# Altium integrated library Samtec_2_mm_Pitch_Socket_Strips.IntLib: 251 symbols (part 2 of 3) (continued)
## SMM-120-02-L-D-K
designator J?
Tiger Eye(TM) Socket Strip, Surface Mount, Vertical, -55 to 125 degC, 2 mm Pitch, 40-Pin, Female, RoHS; Manufacturer: Samtec; PartNumber: SMM-120-02-L-D-K; Pitch: 2 mm; DatasheetVersion: F-214; PackageVersion: AU, 5/1991; PackageReference: SMM-120-02-X-D-K; PackageDescription: 2 mm Socket Strip; Orientation: Vertical; RoHS: True; Temperature Range: -55 to 125 degC; Mounting Technology: Surface Mount; ComponentLink1Description: Manufacturer URL; ComponentLink1URL: http://www.samtec.com; ComponentLink2Description: Datasheet; ComponentLink2URL: http://www.samtec.com/documents/webfiles/pdf/SMM.PDF; ComponentLink3Description: Package Specification; ComponentLink3URL: http://www.samtec.com/documents/webfiles/cpdf/SMM-1XX-XX-XX-D-XX-XX-X-XX-MKT1.pdf
footprint SMTC-SMM-120-02-X-D-K (Socket Strip, 2x20 Pins, Vertical, 2mm Pitch, Female)
pins: 1, 2, 3, 4, 5, 6, 7, 8, 9, 10, 11, 12, 13, 14, 15, 16, 17, 18, 19, 20, 21, 22, 23, 24, 25, 26, 27, 28, 29, 30, 31, 32, 33, 34, 35, 36, 37, 38, 39, 40

## SMM-120-02-L-S
designator J?
Tiger Eye(TM) Socket Strip, Surface Mount, Vertical, -55 to 125 degC, 2 mm Pitch, 20-Pin, Female, RoHS; Manufacturer: Samtec; PartNumber: SMM-120-02-L-S; Pitch: 2 mm; DatasheetVersion: F-214; PackageVersion: BC, 5/1991; PackageReference: SMM-120-02-X-S; PackageDescription: 2 mm Socket Strip (Single Row); Orientation: Vertical; RoHS: True; Temperature Range: -55 to 125 degC; Mounting Technology: Surface Mount; ComponentLink1Description: Manufacturer URL; ComponentLink1URL: http://www.samtec.com; ComponentLink2Description: Datasheet; ComponentLink2URL: http://www.samtec.com/documents/webfiles/pdf/SMM.PDF; ComponentLink3Description: Package Specification; ComponentLink3URL: http://www.samtec.com/documents/webfiles/cpdf/SMM-1XX-XX-XX-S-XX-X-XX-XX-MKT.pdf
footprint SMTC-SMM-120-02-X-S (Socket Strip, 20 Pins, Vertical, 2mm Pitch, Female)
pins: 1, 2, 3, 4, 5, 6, 7, 8, 9, 10, 11, 12, 13, 14, 15, 16, 17, 18, 19, 20

## SMM-120-02-S-D-K
designator J?
Tiger Eye(TM) Socket Strip, Surface Mount, Vertical, -55 to 125 degC, 2 mm Pitch, 40-Pin, Female, RoHS; Manufacturer: Samtec; PartNumber: SMM-120-02-S-D-K; Pitch: 2 mm; DatasheetVersion: F-214; PackageVersion: AU, 5/1991; PackageReference: SMM-120-02-X-D-K; PackageDescription: 2 mm Socket Strip; Orientation: Vertical; RoHS: True; Temperature Range: -55 to 125 degC; Mounting Technology: Surface Mount; ComponentLink1Description: Manufacturer URL; ComponentLink1URL: http://www.samtec.com; ComponentLink2Description: Datasheet; ComponentLink2URL: http://www.samtec.com/documents/webfiles/pdf/SMM.PDF; ComponentLink3Description: Package Specification; ComponentLink3URL: http://www.samtec.com/documents/webfiles/cpdf/SMM-1XX-XX-XX-D-XX-XX-X-XX-MKT1.pdf
footprint SMTC-SMM-120-02-X-D-K (Socket Strip, 2x20 Pins, Vertical, 2mm Pitch, Female)
pins: 1, 2, 3, 4, 5, 6, 7, 8, 9, 10, 11, 12, 13, 14, 15, 16, 17, 18, 19, 20, 21, 22, 23, 24, 25, 26, 27, 28, 29, 30, 31, 32, 33, 34, 35, 36, 37, 38, 39, 40

## SMM-120-02-S-S
designator J?
Tiger Eye(TM) Socket Strip, Surface Mount, Vertical, -55 to 125 degC, 2 mm Pitch, 20-Pin, Female, RoHS; Manufacturer: Samtec; PartNumber: SMM-120-02-S-S; Pitch: 2 mm; DatasheetVersion: F-214; PackageVersion: BC, 5/1991; PackageReference: SMM-120-02-X-S; PackageDescription: 2 mm Socket Strip (Single Row); Supplier 1: Digi-Key; Supplier Part Number 1: SAM1244-20-ND; Orientation: Vertical; RoHS: True; Temperature Range: -55 to 125 degC; Mounting Technology: Surface Mount; ComponentLink1Description: Manufacturer URL; ComponentLink1URL: http://www.samtec.com; ComponentLink2Description: Datasheet; ComponentLink2URL: http://www.samtec.com/documents/webfiles/pdf/SMM.PDF; ComponentLink3Description: Package Specification; ComponentLink3URL: http://www.samtec.com/documents/webfiles/cpdf/SMM-1XX-XX-XX-S-XX-X-XX-XX-MKT.pdf
footprint SMTC-SMM-120-02-X-S (Socket Strip, 20 Pins, Vertical, 2mm Pitch, Female)
pins: 1, 2, 3, 4, 5, 6, 7, 8, 9, 10, 11, 12, 13, 14, 15, 16, 17, 18, 19, 20

## SMM-125-01-F-D
designator J?
Tiger Eye(TM) Socket Strip, Through-hole, Vertical, -55 to 125 degC, 2 mm Pitch, 50-Pin, Female, RoHS; Manufacturer: Samtec; PartNumber: SMM-125-01-F-D; Pitch: 2 mm; DatasheetVersion: F-214; PackageVersion: AU, 5/1991; PackageReference: SMM-125-01-X-D; PackageDescription: 2 mm Socket Strip; Orientation: Vertical; RoHS: True; Temperature Range: -55 to 125 degC; Mounting Technology: Through-hole; ComponentLink1Description: Manufacturer URL; ComponentLink1URL: http://www.samtec.com; ComponentLink2Description: Datasheet; ComponentLink2URL: http://www.samtec.com/documents/webfiles/pdf/SMM.PDF; ComponentLink3Description: Package Specification; ComponentLink3URL: http://www.samtec.com/documents/webfiles/cpdf/SMM-1XX-XX-XX-D-XX-XX-X-XX-MKT1.pdf
footprint SMTC-SMM-125-01-X-D (Socket Strip, 2x25 Pins, Vertical, 2mm Pitch, Female)
pins: 1, 2, 3, 4, 5, 6, 7, 8, 9, 10, 11, 12, 13, 14, 15, 16, 17, 18, 19, 20, 21, 22, 23, 24, 25, 26, 27, 28, 29, 30, 31, 32, 33, 34, 35, 36, 37, 38, 39, 40, 41, 42, 43, 44, 45, 46, 47, 48, 49, 50

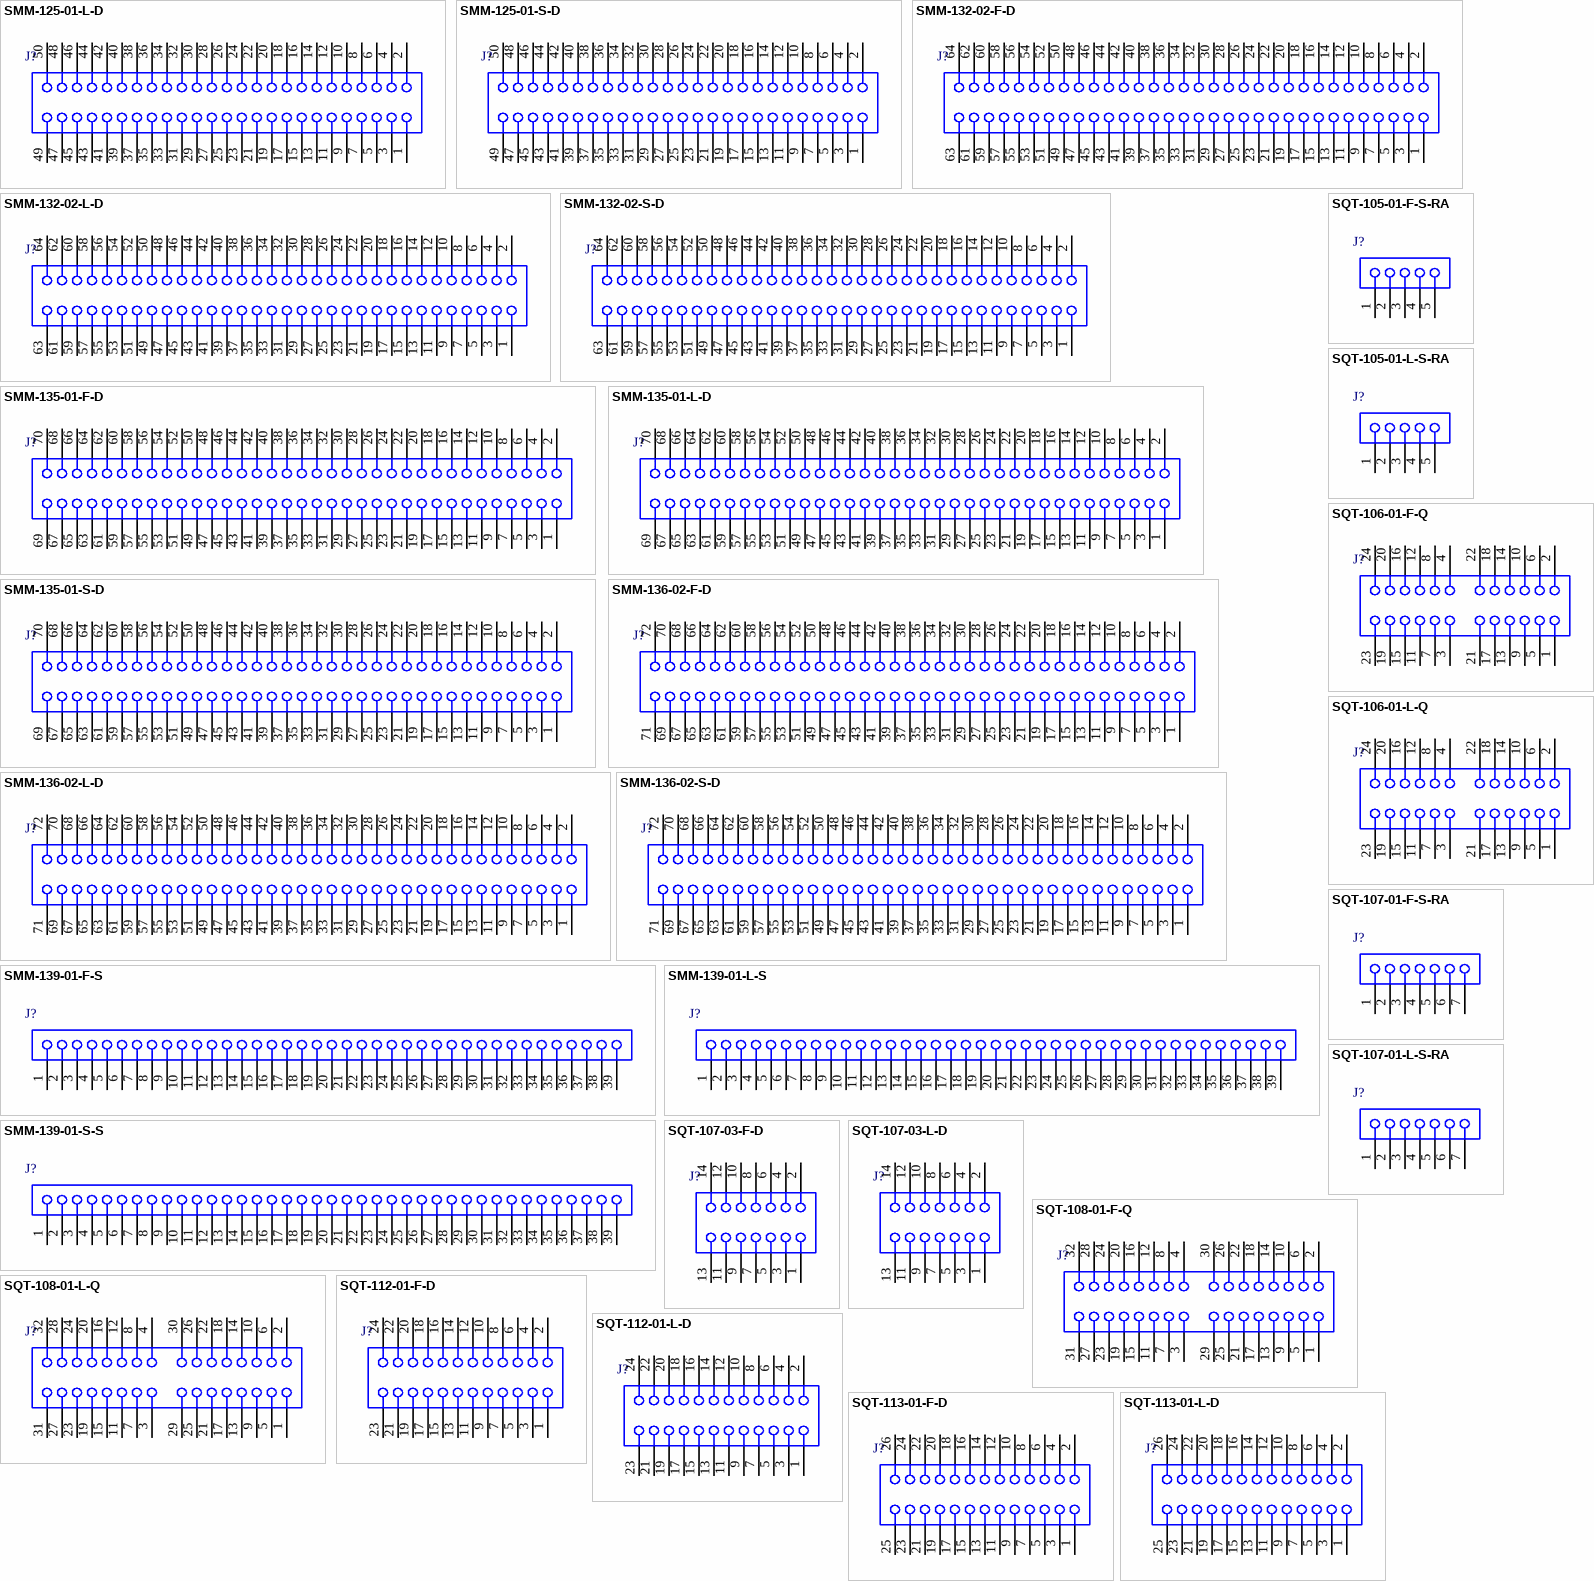
[diagram p5: symbols SMM-125-01-L-D to SQT-113-01-L-D]

## SMM-125-01-L-D
designator J?
Tiger Eye(TM) Socket Strip, Through-hole, Vertical, -55 to 125 degC, 2 mm Pitch, 50-Pin, Female, RoHS; Manufacturer: Samtec; PartNumber: SMM-125-01-L-D; Pitch: 2 mm; DatasheetVersion: F-214; PackageVersion: AU, 5/1991; PackageReference: SMM-125-01-X-D; PackageDescription: 2 mm Socket Strip; Orientation: Vertical; RoHS: True; Temperature Range: -55 to 125 degC; Mounting Technology: Through-hole; ComponentLink1Description: Manufacturer URL; ComponentLink1URL: http://www.samtec.com; ComponentLink2Description: Datasheet; ComponentLink2URL: http://www.samtec.com/documents/webfiles/pdf/SMM.PDF; ComponentLink3Description: Package Specification; ComponentLink3URL: http://www.samtec.com/documents/webfiles/cpdf/SMM-1XX-XX-XX-D-XX-XX-X-XX-MKT1.pdf
footprint SMTC-SMM-125-01-X-D (Socket Strip, 2x25 Pins, Vertical, 2mm Pitch, Female)
pins: 1, 2, 3, 4, 5, 6, 7, 8, 9, 10, 11, 12, 13, 14, 15, 16, 17, 18, 19, 20, 21, 22, 23, 24, 25, 26, 27, 28, 29, 30, 31, 32, 33, 34, 35, 36, 37, 38, 39, 40, 41, 42, 43, 44, 45, 46, 47, 48, 49, 50

## SMM-125-01-S-D
designator J?
Tiger Eye(TM) Socket Strip, Through-hole, Vertical, -55 to 125 degC, 2 mm Pitch, 50-Pin, Female, RoHS; Manufacturer: Samtec; PartNumber: SMM-125-01-S-D; Pitch: 2 mm; DatasheetVersion: F-214; PackageVersion: AU, 5/1991; PackageReference: SMM-125-01-X-D; PackageDescription: 2 mm Socket Strip; Orientation: Vertical; RoHS: True; Temperature Range: -55 to 125 degC; Mounting Technology: Through-hole; ComponentLink1Description: Manufacturer URL; ComponentLink1URL: http://www.samtec.com; ComponentLink2Description: Datasheet; ComponentLink2URL: http://www.samtec.com/documents/webfiles/pdf/SMM.PDF; ComponentLink3Description: Package Specification; ComponentLink3URL: http://www.samtec.com/documents/webfiles/cpdf/SMM-1XX-XX-XX-D-XX-XX-X-XX-MKT1.pdf
footprint SMTC-SMM-125-01-X-D (Socket Strip, 2x25 Pins, Vertical, 2mm Pitch, Female)
pins: 1, 2, 3, 4, 5, 6, 7, 8, 9, 10, 11, 12, 13, 14, 15, 16, 17, 18, 19, 20, 21, 22, 23, 24, 25, 26, 27, 28, 29, 30, 31, 32, 33, 34, 35, 36, 37, 38, 39, 40, 41, 42, 43, 44, 45, 46, 47, 48, 49, 50

## SMM-132-02-F-D
designator J?
Tiger Eye(TM) Socket Strip, Surface Mount, Vertical, -55 to 125 degC, 2 mm Pitch, 64-Pin, Female, RoHS; Manufacturer: Samtec; PartNumber: SMM-132-02-F-D; Pitch: 2 mm; DatasheetVersion: F-214; PackageVersion: AU, 5/1991; PackageReference: SMM-132-02-X-D; PackageDescription: 2 mm Socket Strip; Orientation: Vertical; RoHS: True; Temperature Range: -55 to 125 degC; Mounting Technology: Surface Mount; ComponentLink1Description: Manufacturer URL; ComponentLink1URL: http://www.samtec.com; ComponentLink2Description: Datasheet; ComponentLink2URL: http://www.samtec.com/documents/webfiles/pdf/SMM.PDF; ComponentLink3Description: Package Specification; ComponentLink3URL: http://www.samtec.com/documents/webfiles/cpdf/SMM-1XX-XX-XX-D-XX-XX-X-XX-MKT1.pdf
footprint SMTC-SMM-132-02-X-D (Socket Strip, 2x32 Pins, Vertical, 2mm Pitch, Female)
pins: 1, 2, 3, 4, 5, 6, 7, 8, 9, 10, 11, 12, 13, 14, 15, 16, 17, 18, 19, 20, 21, 22, 23, 24, 25, 26, 27, 28, 29, 30, 31, 32, 33, 34, 35, 36, 37, 38, 39, 40, 41, 42, 43, 44, 45, 46, 47, 48, 49, 50, 51, 52, 53, 54, 55, 56, 57, 58, 59, 60, 61, 62, 63, 64

## SMM-132-02-L-D
designator J?
Tiger Eye(TM) Socket Strip, Surface Mount, Vertical, -55 to 125 degC, 2 mm Pitch, 64-Pin, Female, RoHS; Manufacturer: Samtec; PartNumber: SMM-132-02-L-D; Pitch: 2 mm; DatasheetVersion: F-214; PackageVersion: AU, 5/1991; PackageReference: SMM-132-02-X-D; PackageDescription: 2 mm Socket Strip; Orientation: Vertical; RoHS: True; Temperature Range: -55 to 125 degC; Mounting Technology: Surface Mount; ComponentLink1Description: Manufacturer URL; ComponentLink1URL: http://www.samtec.com; ComponentLink2Description: Datasheet; ComponentLink2URL: http://www.samtec.com/documents/webfiles/pdf/SMM.PDF; ComponentLink3Description: Package Specification; ComponentLink3URL: http://www.samtec.com/documents/webfiles/cpdf/SMM-1XX-XX-XX-D-XX-XX-X-XX-MKT1.pdf
footprint SMTC-SMM-132-02-X-D (Socket Strip, 2x32 Pins, Vertical, 2mm Pitch, Female)
pins: 1, 2, 3, 4, 5, 6, 7, 8, 9, 10, 11, 12, 13, 14, 15, 16, 17, 18, 19, 20, 21, 22, 23, 24, 25, 26, 27, 28, 29, 30, 31, 32, 33, 34, 35, 36, 37, 38, 39, 40, 41, 42, 43, 44, 45, 46, 47, 48, 49, 50, 51, 52, 53, 54, 55, 56, 57, 58, 59, 60, 61, 62, 63, 64

## SMM-132-02-S-D
designator J?
Tiger Eye(TM) Socket Strip, Surface Mount, Vertical, -55 to 125 degC, 2 mm Pitch, 64-Pin, Female, RoHS; Manufacturer: Samtec; PartNumber: SMM-132-02-S-D; Pitch: 2 mm; DatasheetVersion: F-214; PackageVersion: AU, 5/1991; PackageReference: SMM-132-02-X-D; PackageDescription: 2 mm Socket Strip; Supplier 1: Digi-Key; Supplier Part Number 1: SAM1243-32-ND; Orientation: Vertical; RoHS: True; Temperature Range: -55 to 125 degC; Mounting Technology: Surface Mount; ComponentLink1Description: Manufacturer URL; ComponentLink1URL: http://www.samtec.com; ComponentLink2Description: Datasheet; ComponentLink2URL: http://www.samtec.com/documents/webfiles/pdf/SMM.PDF; ComponentLink3Description: Package Specification; ComponentLink3URL: http://www.samtec.com/documents/webfiles/cpdf/SMM-1XX-XX-XX-D-XX-XX-X-XX-MKT1.pdf
footprint SMTC-SMM-132-02-X-D (Socket Strip, 2x32 Pins, Vertical, 2mm Pitch, Female)
pins: 1, 2, 3, 4, 5, 6, 7, 8, 9, 10, 11, 12, 13, 14, 15, 16, 17, 18, 19, 20, 21, 22, 23, 24, 25, 26, 27, 28, 29, 30, 31, 32, 33, 34, 35, 36, 37, 38, 39, 40, 41, 42, 43, 44, 45, 46, 47, 48, 49, 50, 51, 52, 53, 54, 55, 56, 57, 58, 59, 60, 61, 62, 63, 64

## SMM-135-01-F-D
designator J?
Tiger Eye(TM) Socket Strip, Through-hole, Vertical, -55 to 125 degC, 2 mm Pitch, 70-Pin, Female, RoHS; Manufacturer: Samtec; PartNumber: SMM-135-01-F-D; Pitch: 2 mm; DatasheetVersion: F-214; PackageVersion: AU, 5/1991; PackageReference: SMM-135-01-X-D; PackageDescription: 2 mm Socket Strip; Orientation: Vertical; RoHS: True; Temperature Range: -55 to 125 degC; Mounting Technology: Through-hole; ComponentLink1Description: Manufacturer URL; ComponentLink1URL: http://www.samtec.com; ComponentLink2Description: Datasheet; ComponentLink2URL: http://www.samtec.com/documents/webfiles/pdf/SMM.PDF; ComponentLink3Description: Package Specification; ComponentLink3URL: http://www.samtec.com/documents/webfiles/cpdf/SMM-1XX-XX-XX-D-XX-XX-X-XX-MKT1.pdf
footprint SMTC-SMM-135-01-X-D (Socket Strip, 2x35 Pins, Vertical, 2mm Pitch, Female)
pins: 1, 2, 3, 4, 5, 6, 7, 8, 9, 10, 11, 12, 13, 14, 15, 16, 17, 18, 19, 20, 21, 22, 23, 24, 25, 26, 27, 28, 29, 30, 31, 32, 33, 34, 35, 36, 37, 38, 39, 40, 41, 42, 43, 44, 45, 46, 47, 48, 49, 50, 51, 52, 53, 54, 55, 56, 57, 58, 59, 60, 61, 62, 63, 64, 65, 66, 67, 68, 69, 70

## SMM-135-01-L-D
designator J?
Tiger Eye(TM) Socket Strip, Through-hole, Vertical, -55 to 125 degC, 2 mm Pitch, 70-Pin, Female, RoHS; Manufacturer: Samtec; PartNumber: SMM-135-01-L-D; Pitch: 2 mm; DatasheetVersion: F-214; PackageVersion: AU, 5/1991; PackageReference: SMM-135-01-X-D; PackageDescription: 2 mm Socket Strip; Orientation: Vertical; RoHS: True; Temperature Range: -55 to 125 degC; Mounting Technology: Through-hole; ComponentLink1Description: Manufacturer URL; ComponentLink1URL: http://www.samtec.com; ComponentLink2Description: Datasheet; ComponentLink2URL: http://www.samtec.com/documents/webfiles/pdf/SMM.PDF; ComponentLink3Description: Package Specification; ComponentLink3URL: http://www.samtec.com/documents/webfiles/cpdf/SMM-1XX-XX-XX-D-XX-XX-X-XX-MKT1.pdf
footprint SMTC-SMM-135-01-X-D (Socket Strip, 2x35 Pins, Vertical, 2mm Pitch, Female)
pins: 1, 2, 3, 4, 5, 6, 7, 8, 9, 10, 11, 12, 13, 14, 15, 16, 17, 18, 19, 20, 21, 22, 23, 24, 25, 26, 27, 28, 29, 30, 31, 32, 33, 34, 35, 36, 37, 38, 39, 40, 41, 42, 43, 44, 45, 46, 47, 48, 49, 50, 51, 52, 53, 54, 55, 56, 57, 58, 59, 60, 61, 62, 63, 64, 65, 66, 67, 68, 69, 70

## SMM-135-01-S-D
designator J?
Tiger Eye(TM) Socket Strip, Through-hole, Vertical, -55 to 125 degC, 2 mm Pitch, 70-Pin, Female, RoHS; Manufacturer: Samtec; PartNumber: SMM-135-01-S-D; Pitch: 2 mm; DatasheetVersion: F-214; PackageVersion: AU, 5/1991; PackageReference: SMM-135-01-X-D; PackageDescription: 2 mm Socket Strip; Orientation: Vertical; RoHS: True; Temperature Range: -55 to 125 degC; Mounting Technology: Through-hole; ComponentLink1Description: Manufacturer URL; ComponentLink1URL: http://www.samtec.com; ComponentLink2Description: Datasheet; ComponentLink2URL: http://www.samtec.com/documents/webfiles/pdf/SMM.PDF; ComponentLink3Description: Package Specification; ComponentLink3URL: http://www.samtec.com/documents/webfiles/cpdf/SMM-1XX-XX-XX-D-XX-XX-X-XX-MKT1.pdf
footprint SMTC-SMM-135-01-X-D (Socket Strip, 2x35 Pins, Vertical, 2mm Pitch, Female)
pins: 1, 2, 3, 4, 5, 6, 7, 8, 9, 10, 11, 12, 13, 14, 15, 16, 17, 18, 19, 20, 21, 22, 23, 24, 25, 26, 27, 28, 29, 30, 31, 32, 33, 34, 35, 36, 37, 38, 39, 40, 41, 42, 43, 44, 45, 46, 47, 48, 49, 50, 51, 52, 53, 54, 55, 56, 57, 58, 59, 60, 61, 62, 63, 64, 65, 66, 67, 68, 69, 70

## SMM-136-02-F-D
designator J?
Tiger Eye(TM) Socket Strip, Surface Mount, Vertical, -55 to 125 degC, 2 mm Pitch, 72-Pin, Female, RoHS; Manufacturer: Samtec; PartNumber: SMM-136-02-F-D; Pitch: 2 mm; DatasheetVersion: F-214; PackageVersion: AU, 5/1991; PackageReference: SMM-136-02-X-D; PackageDescription: 2 mm Socket Strip; Orientation: Vertical; RoHS: True; Temperature Range: -55 to 125 degC; Mounting Technology: Surface Mount; ComponentLink1Description: Manufacturer URL; ComponentLink1URL: http://www.samtec.com; ComponentLink2Description: Datasheet; ComponentLink2URL: http://www.samtec.com/documents/webfiles/pdf/SMM.PDF; ComponentLink3Description: Package Specification; ComponentLink3URL: http://www.samtec.com/documents/webfiles/cpdf/SMM-1XX-XX-XX-D-XX-XX-X-XX-MKT1.pdf
footprint SMTC-SMM-136-02-X-D (Socket Strip, 2x36 Pins, Vertical, 2mm Pitch, Female)
pins: 1, 2, 3, 4, 5, 6, 7, 8, 9, 10, 11, 12, 13, 14, 15, 16, 17, 18, 19, 20, 21, 22, 23, 24, 25, 26, 27, 28, 29, 30, 31, 32, 33, 34, 35, 36, 37, 38, 39, 40, 41, 42, 43, 44, 45, 46, 47, 48, 49, 50, 51, 52, 53, 54, 55, 56, 57, 58, 59, 60, 61, 62, 63, 64, 65, 66, 67, 68, 69, 70, 71, 72

## SMM-136-02-L-D
designator J?
Tiger Eye(TM) Socket Strip, Surface Mount, Vertical, -55 to 125 degC, 2 mm Pitch, 72-Pin, Female, RoHS; Manufacturer: Samtec; PartNumber: SMM-136-02-L-D; Pitch: 2 mm; DatasheetVersion: F-214; PackageVersion: AU, 5/1991; PackageReference: SMM-136-02-X-D; PackageDescription: 2 mm Socket Strip; Orientation: Vertical; RoHS: True; Temperature Range: -55 to 125 degC; Mounting Technology: Surface Mount; ComponentLink1Description: Manufacturer URL; ComponentLink1URL: http://www.samtec.com; ComponentLink2Description: Datasheet; ComponentLink2URL: http://www.samtec.com/documents/webfiles/pdf/SMM.PDF; ComponentLink3Description: Package Specification; ComponentLink3URL: http://www.samtec.com/documents/webfiles/cpdf/SMM-1XX-XX-XX-D-XX-XX-X-XX-MKT1.pdf
footprint SMTC-SMM-136-02-X-D (Socket Strip, 2x36 Pins, Vertical, 2mm Pitch, Female)
pins: 1, 2, 3, 4, 5, 6, 7, 8, 9, 10, 11, 12, 13, 14, 15, 16, 17, 18, 19, 20, 21, 22, 23, 24, 25, 26, 27, 28, 29, 30, 31, 32, 33, 34, 35, 36, 37, 38, 39, 40, 41, 42, 43, 44, 45, 46, 47, 48, 49, 50, 51, 52, 53, 54, 55, 56, 57, 58, 59, 60, 61, 62, 63, 64, 65, 66, 67, 68, 69, 70, 71, 72

## SMM-136-02-S-D
designator J?
Tiger Eye(TM) Socket Strip, Surface Mount, Vertical, -55 to 125 degC, 2 mm Pitch, 72-Pin, Female, RoHS; Manufacturer: Samtec; PartNumber: SMM-136-02-S-D; Pitch: 2 mm; DatasheetVersion: F-214; PackageVersion: AU, 5/1991; PackageReference: SMM-136-02-X-D; PackageDescription: 2 mm Socket Strip; Supplier 1: Digi-Key; Supplier Part Number 1: SAM1243-36-ND; Orientation: Vertical; RoHS: True; Temperature Range: -55 to 125 degC; Mounting Technology: Surface Mount; ComponentLink1Description: Manufacturer URL; ComponentLink1URL: http://www.samtec.com; ComponentLink2Description: Datasheet; ComponentLink2URL: http://www.samtec.com/documents/webfiles/pdf/SMM.PDF; ComponentLink3Description: Package Specification; ComponentLink3URL: http://www.samtec.com/documents/webfiles/cpdf/SMM-1XX-XX-XX-D-XX-XX-X-XX-MKT1.pdf
footprint SMTC-SMM-136-02-X-D (Socket Strip, 2x36 Pins, Vertical, 2mm Pitch, Female)
pins: 1, 2, 3, 4, 5, 6, 7, 8, 9, 10, 11, 12, 13, 14, 15, 16, 17, 18, 19, 20, 21, 22, 23, 24, 25, 26, 27, 28, 29, 30, 31, 32, 33, 34, 35, 36, 37, 38, 39, 40, 41, 42, 43, 44, 45, 46, 47, 48, 49, 50, 51, 52, 53, 54, 55, 56, 57, 58, 59, 60, 61, 62, 63, 64, 65, 66, 67, 68, 69, 70, 71, 72

## SMM-139-01-F-S
designator J?
Tiger Eye(TM) Socket Strip, Through-hole, Vertical, -55 to 125 degC, 2 mm Pitch, 39-Pin, Female, RoHS; Manufacturer: Samtec; PartNumber: SMM-139-01-F-S; Pitch: 2 mm; DatasheetVersion: F-214; PackageVersion: BC, 5/1991; PackageReference: SMM-139-01-X-S; PackageDescription: 2 mm Socket Strip (Single Row); Orientation: Vertical; RoHS: True; Temperature Range: -55 to 125 degC; Mounting Technology: Through-hole; ComponentLink1Description: Manufacturer URL; ComponentLink1URL: http://www.samtec.com; ComponentLink2Description: Datasheet; ComponentLink2URL: http://www.samtec.com/documents/webfiles/pdf/SMM.PDF; ComponentLink3Description: Package Specification; ComponentLink3URL: http://www.samtec.com/documents/webfiles/cpdf/SMM-1XX-XX-XX-S-XX-X-XX-XX-MKT.pdf
footprint SMTC-SMM-139-01-X-S (Socket Strip, 1x39 Pins, Vertical, 2mm Pitch, Female)
pins: 1, 2, 3, 4, 5, 6, 7, 8, 9, 10, 11, 12, 13, 14, 15, 16, 17, 18, 19, 20, 21, 22, 23, 24, 25, 26, 27, 28, 29, 30, 31, 32, 33, 34, 35, 36, 37, 38, 39

## SMM-139-01-L-S
designator J?
Tiger Eye(TM) Socket Strip, Through-hole, Vertical, -55 to 125 degC, 2 mm Pitch, 39-Pin, Female, RoHS; Manufacturer: Samtec; PartNumber: SMM-139-01-L-S; Pitch: 2 mm; DatasheetVersion: F-214; PackageVersion: BC, 5/1991; PackageReference: SMM-139-01-X-S; PackageDescription: 2 mm Socket Strip (Single Row); Orientation: Vertical; RoHS: True; Temperature Range: -55 to 125 degC; Mounting Technology: Through-hole; ComponentLink1Description: Manufacturer URL; ComponentLink1URL: http://www.samtec.com; ComponentLink2Description: Datasheet; ComponentLink2URL: http://www.samtec.com/documents/webfiles/pdf/SMM.PDF; ComponentLink3Description: Package Specification; ComponentLink3URL: http://www.samtec.com/documents/webfiles/cpdf/SMM-1XX-XX-XX-S-XX-X-XX-XX-MKT.pdf
footprint SMTC-SMM-139-01-X-S (Socket Strip, 1x39 Pins, Vertical, 2mm Pitch, Female)
pins: 1, 2, 3, 4, 5, 6, 7, 8, 9, 10, 11, 12, 13, 14, 15, 16, 17, 18, 19, 20, 21, 22, 23, 24, 25, 26, 27, 28, 29, 30, 31, 32, 33, 34, 35, 36, 37, 38, 39

## SMM-139-01-S-S
designator J?
Tiger Eye(TM) Socket Strip, Through-hole, Vertical, -55 to 125 degC, 2 mm Pitch, 39-Pin, Female, RoHS; Manufacturer: Samtec; PartNumber: SMM-139-01-S-S; Pitch: 2 mm; DatasheetVersion: F-214; PackageVersion: BC, 5/1991; PackageReference: SMM-139-01-X-S; PackageDescription: 2 mm Socket Strip (Single Row); Orientation: Vertical; RoHS: True; Temperature Range: -55 to 125 degC; Mounting Technology: Through-hole; ComponentLink1Description: Manufacturer URL; ComponentLink1URL: http://www.samtec.com; ComponentLink2Description: Datasheet; ComponentLink2URL: http://www.samtec.com/documents/webfiles/pdf/SMM.PDF; ComponentLink3Description: Package Specification; ComponentLink3URL: http://www.samtec.com/documents/webfiles/cpdf/SMM-1XX-XX-XX-S-XX-X-XX-XX-MKT.pdf
footprint SMTC-SMM-139-01-X-S (Socket Strip, 1x39 Pins, Vertical, 2mm Pitch, Female)
pins: 1, 2, 3, 4, 5, 6, 7, 8, 9, 10, 11, 12, 13, 14, 15, 16, 17, 18, 19, 20, 21, 22, 23, 24, 25, 26, 27, 28, 29, 30, 31, 32, 33, 34, 35, 36, 37, 38, 39

## SQT-105-01-F-S-RA
designator J?
Cost-Effective Rugged Socket, Through-hole, Right Angle, -55 to 125 degC, 2 mm Pitch, 5-Pin, Female, RoHS; Manufacturer: Samtec; PartNumber: SQT-105-01-F-S-RA; Pitch: 2 mm; DatasheetVersion: F-214; PackageVersion: BY, 7/1995; PackageReference: SQT-105-01-X-S-RA; PackageDescription: 2mm Socket Strip Assembly; Orientation: Right Angle; RoHS: True; Temperature Range: -55 to 125 degC; Mounting Technology: Through-hole; ComponentLink1Description: Manufacturer URL; ComponentLink1URL: http://www.samtec.com; ComponentLink2Description: Datasheet; ComponentLink2URL: http://www.samtec.com/documents/webfiles/pdf/SQT_TH.PDF; ComponentLink3Description: Package Specification; ComponentLink3URL: http://www.samtec.com/documents/webfiles/cpdf/SQT-1XX-XX-XXX-X-XXX-XXX-MKT.pdf
footprint SMTC-SQT-105-01-X-S-RA (Socket Strip Assembly, 1x5 Pins, Right Anlge, 2mm Pitch, Female)
pins: 1, 2, 3, 4, 5

## SQT-105-01-L-S-RA
designator J?
Cost-Effective Rugged Socket, Through-hole, Right Angle, -55 to 125 degC, 2 mm Pitch, 5-Pin, Female, RoHS; Manufacturer: Samtec; PartNumber: SQT-105-01-L-S-RA; Pitch: 2 mm; DatasheetVersion: F-214; PackageVersion: BY, 7/1995; PackageReference: SQT-105-01-X-S-RA; PackageDescription: 2mm Socket Strip Assembly; Supplier 1: Digi-Key; Supplier Part Number 1: SAM1248-05-ND; Supplier 2: Farnell; Supplier Part Number 2: 1668162; Supplier 3: Newark; Supplier Part Number 3: 11P7253; Orientation: Right Angle; RoHS: True; Temperature Range: -55 to 125 degC; Mounting Technology: Through-hole; ComponentLink1Description: Manufacturer URL; ComponentLink1URL: http://www.samtec.com; ComponentLink2Description: Datasheet; ComponentLink2URL: http://www.samtec.com/documents/webfiles/pdf/SQT_TH.PDF; ComponentLink3Description: Package Specification; ComponentLink3URL: http://www.samtec.com/documents/webfiles/cpdf/SQT-1XX-XX-XXX-X-XXX-XXX-MKT.pdf
footprint SMTC-SQT-105-01-X-S-RA (Socket Strip Assembly, 1x5 Pins, Right Anlge, 2mm Pitch, Female)
pins: 1, 2, 3, 4, 5

## SQT-106-01-F-Q
designator J?
Cost-Effective Rugged Socket, Through-hole, Vertical, -55 to 125 degC, 2 mm Pitch, 24-Pin, Female, RoHS; Manufacturer: Samtec; PartNumber: SQT-106-01-F-Q; Pitch: 2 mm; DatasheetVersion: F-214; PackageVersion: BY, 7/1995; PackageReference: SQT-106-01-X-Q; PackageDescription: 2mm Socket Strip Assembly; Orientation: Vertical; RoHS: True; Temperature Range: -55 to 125 degC; Mounting Technology: Through-hole; ComponentLink1Description: Manufacturer URL; ComponentLink1URL: http://www.samtec.com; ComponentLink2Description: Datasheet; ComponentLink2URL: http://www.samtec.com/documents/webfiles/pdf/SQT_TH.PDF; ComponentLink3Description: Package Specification; ComponentLink3URL: http://www.samtec.com/documents/webfiles/cpdf/SQT-1XX-XX-XXX-X-XXX-XXX-MKT.pdf
footprint SMTC-SQT-106-01-X-Q (Socket Strip Assembly, 4x6 Pins, Vertical, 2mm Pitch, Female)
pins: 1, 2, 3, 4, 5, 6, 7, 8, 9, 10, 11, 12, 13, 14, 15, 16, 17, 18, 19, 20, 21, 22, 23, 24

## SQT-106-01-L-Q
designator J?
Cost-Effective Rugged Socket, Through-hole, Vertical, -55 to 125 degC, 2 mm Pitch, 24-Pin, Female, RoHS; Manufacturer: Samtec; PartNumber: SQT-106-01-L-Q; Pitch: 2 mm; DatasheetVersion: F-214; PackageVersion: BY, 7/1995; PackageReference: SQT-106-01-X-Q; PackageDescription: 2mm Socket Strip Assembly; Orientation: Vertical; RoHS: True; Temperature Range: -55 to 125 degC; Mounting Technology: Through-hole; ComponentLink1Description: Manufacturer URL; ComponentLink1URL: http://www.samtec.com; ComponentLink2Description: Datasheet; ComponentLink2URL: http://www.samtec.com/documents/webfiles/pdf/SQT_TH.PDF; ComponentLink3Description: Package Specification; ComponentLink3URL: http://www.samtec.com/documents/webfiles/cpdf/SQT-1XX-XX-XXX-X-XXX-XXX-MKT.pdf
footprint SMTC-SQT-106-01-X-Q (Socket Strip Assembly, 4x6 Pins, Vertical, 2mm Pitch, Female)
pins: 1, 2, 3, 4, 5, 6, 7, 8, 9, 10, 11, 12, 13, 14, 15, 16, 17, 18, 19, 20, 21, 22, 23, 24

## SQT-107-01-F-S-RA
designator J?
Cost-Effective Rugged Socket, Through-hole, Right Angle, -55 to 125 degC, 2 mm Pitch, 7-Pin, Female, RoHS; Manufacturer: Samtec; PartNumber: SQT-107-01-F-S-RA; Pitch: 2 mm; DatasheetVersion: F-214; PackageVersion: BY, 7/1995; PackageReference: SQT-107-01-X-S-RA; PackageDescription: 2mm Socket Strip Assembly; Orientation: Right Angle; RoHS: True; Temperature Range: -55 to 125 degC; Mounting Technology: Through-hole; ComponentLink1Description: Manufacturer URL; ComponentLink1URL: http://www.samtec.com; ComponentLink2Description: Datasheet; ComponentLink2URL: http://www.samtec.com/documents/webfiles/pdf/SQT_TH.PDF; ComponentLink3Description: Package Specification; ComponentLink3URL: http://www.samtec.com/documents/webfiles/cpdf/SQT-1XX-XX-XXX-X-XXX-XXX-MKT.pdf
footprint SMTC-SQT-107-01-X-S-RA (Socket Strip Assembly, 1x7 Pins, Right Anlge, 2mm Pitch, Female)
pins: 1, 2, 3, 4, 5, 6, 7

## SQT-107-01-L-S-RA
designator J?
Cost-Effective Rugged Socket, Through-hole, Right Angle, -55 to 125 degC, 2 mm Pitch, 7-Pin, Female, RoHS; Manufacturer: Samtec; PartNumber: SQT-107-01-L-S-RA; Pitch: 2 mm; DatasheetVersion: F-214; PackageVersion: BY, 7/1995; PackageReference: SQT-107-01-X-S-RA; PackageDescription: 2mm Socket Strip Assembly; Supplier 1: Digi-Key; Supplier Part Number 1: SAM1248-07-ND; Orientation: Right Angle; RoHS: True; Temperature Range: -55 to 125 degC; Mounting Technology: Through-hole; ComponentLink1Description: Manufacturer URL; ComponentLink1URL: http://www.samtec.com; ComponentLink2Description: Datasheet; ComponentLink2URL: http://www.samtec.com/documents/webfiles/pdf/SQT_TH.PDF; ComponentLink3Description: Package Specification; ComponentLink3URL: http://www.samtec.com/documents/webfiles/cpdf/SQT-1XX-XX-XXX-X-XXX-XXX-MKT.pdf
footprint SMTC-SQT-107-01-X-S-RA (Socket Strip Assembly, 1x7 Pins, Right Anlge, 2mm Pitch, Female)
pins: 1, 2, 3, 4, 5, 6, 7

## SQT-107-03-F-D
designator J?
Cost-Effective Rugged Socket, Through-hole, Vertical, -55 to 125 degC, 2 mm Pitch, 14-Pin, Female, RoHS; Manufacturer: Samtec; PartNumber: SQT-107-03-F-D; Pitch: 2 mm; DatasheetVersion: F-214; PackageVersion: BY, 7/1995; PackageReference: SQT-107-03-X-D; PackageDescription: 2mm Socket Strip Assembly; Orientation: Vertical; RoHS: True; Temperature Range: -55 to 125 degC; Mounting Technology: Through-hole; ComponentLink1Description: Manufacturer URL; ComponentLink1URL: http://www.samtec.com; ComponentLink2Description: Datasheet; ComponentLink2URL: http://www.samtec.com/documents/webfiles/pdf/SQT_TH.PDF; ComponentLink3Description: Package Specification; ComponentLink3URL: http://www.samtec.com/documents/webfiles/cpdf/SQT-1XX-XX-XXX-X-XXX-XXX-MKT.pdf
footprint SMTC-SQT-107-03-X-D (Socket Strip Assembly, 2x7 Pins, Vertical, 2mm Pitch, Female)
pins: 1, 2, 3, 4, 5, 6, 7, 8, 9, 10, 11, 12, 13, 14

## SQT-107-03-L-D
designator J?
Cost-Effective Rugged Socket, Through-hole, Vertical, -55 to 125 degC, 2 mm Pitch, 14-Pin, Female, RoHS; Manufacturer: Samtec; PartNumber: SQT-107-03-L-D; Pitch: 2 mm; DatasheetVersion: F-214; PackageVersion: BY, 7/1995; PackageReference: SQT-107-03-X-D; PackageDescription: 2mm Socket Strip Assembly; Supplier 1: Newark; Supplier Part Number 1: 80P8075; Orientation: Vertical; RoHS: True; Temperature Range: -55 to 125 degC; Mounting Technology: Through-hole; ComponentLink1Description: Manufacturer URL; ComponentLink1URL: http://www.samtec.com; ComponentLink2Description: Datasheet; ComponentLink2URL: http://www.samtec.com/documents/webfiles/pdf/SQT_TH.PDF; ComponentLink3Description: Package Specification; ComponentLink3URL: http://www.samtec.com/documents/webfiles/cpdf/SQT-1XX-XX-XXX-X-XXX-XXX-MKT.pdf
footprint SMTC-SQT-107-03-X-D (Socket Strip Assembly, 2x7 Pins, Vertical, 2mm Pitch, Female)
pins: 1, 2, 3, 4, 5, 6, 7, 8, 9, 10, 11, 12, 13, 14

## SQT-108-01-F-Q
designator J?
Cost-Effective Rugged Socket, Through-hole, Vertical, -55 to 125 degC, 2 mm Pitch, 32-Pin, Female, RoHS; Manufacturer: Samtec; PartNumber: SQT-108-01-F-Q; Pitch: 2 mm; DatasheetVersion: F-214; PackageVersion: BY, 7/1995; PackageReference: SQT-108-01-X-Q; PackageDescription: 2mm Socket Strip Assembly; Orientation: Vertical; RoHS: True; Temperature Range: -55 to 125 degC; Mounting Technology: Through-hole; ComponentLink1Description: Manufacturer URL; ComponentLink1URL: http://www.samtec.com; ComponentLink2Description: Datasheet; ComponentLink2URL: http://www.samtec.com/documents/webfiles/pdf/SQT_TH.PDF; ComponentLink3Description: Package Specification; ComponentLink3URL: http://www.samtec.com/documents/webfiles/cpdf/SQT-1XX-XX-XXX-X-XXX-XXX-MKT.pdf
footprint SMTC-SQT-108-01-X-Q (Socket Strip Assembly, 4x8 Pins, Vertical, 2mm Pitch, Female)
pins: 1, 2, 3, 4, 5, 6, 7, 8, 9, 10, 11, 12, 13, 14, 15, 16, 17, 18, 19, 20, 21, 22, 23, 24, 25, 26, 27, 28, 29, 30, 31, 32
